# Altium schematic symbol library jlcpcb_2025_04_resistors_extended_2512.schlib: 2667 symbols (part 6 of 14) (continued)
## CR2512J330RE04Z
designator R?  Resistance: 330Ω  (hidden comment: *)
Resistor, 330Ω, ±5%, 1W, 200V, ±100ppm/℃, -55℃~+155℃, SMD 2512; Manufacturer: Uniroyal; Manufacturer Part Number: CR2512J330RE04Z; Supplier 1: LCSC; Supplier Part Number 1: C245723; JLCPCB Part Number: C245723; Power Rating: 1W; Category: Resistors; Package Size: 2512; JLCPCB Basic Part: Yes; Tolerance: ±5%; Voltage Rating: 200V; Temperature Coefficient: ±100ppm/℃; Temperature Rating: -55℃~+155℃; ComponentLink1Description: Datasheet; ComponentLink1URL: https://wmsc.lcsc.com/wmsc/upload/file/pdf/v2/lcsc/2304140030_Ever-Ohms-Tech-CR2512J330RE04Z_C245723.pdf; ComponentLink2Description: JLCPCB Part URL; ComponentLink2URL: https://jlcpcb.com/partdetail/C245723
pins: 1, 2
1 alternate drawing of the same symbol

## CR2512J360RE04Z
designator R?  Resistance: 360Ω  (hidden comment: *)
Resistor, 360Ω, ±5%, 1W, 200V, ±100ppm/℃, -55℃~+155℃, SMD 2512; Manufacturer: Uniroyal; Manufacturer Part Number: CR2512J360RE04Z; Supplier 1: LCSC; Supplier Part Number 1: C245724; JLCPCB Part Number: C245724; Power Rating: 1W; Category: Resistors; Package Size: 2512; JLCPCB Basic Part: Yes; Tolerance: ±5%; Voltage Rating: 200V; Temperature Coefficient: ±100ppm/℃; Temperature Rating: -55℃~+155℃; ComponentLink1Description: Datasheet; ComponentLink1URL: https://wmsc.lcsc.com/wmsc/upload/file/pdf/v2/lcsc/2304140030_Ever-Ohms-Tech-CR2512J360RE04Z_C245724.pdf; ComponentLink2Description: JLCPCB Part URL; ComponentLink2URL: https://jlcpcb.com/partdetail/C245724
pins: 1, 2
1 alternate drawing of the same symbol

## CR2512J390KE04Z
designator R?  Resistance: 390kΩ  (hidden comment: *)
Resistor, 390kΩ, ±5%, 1W, 200V, ±100ppm/℃, -55℃~+155℃, SMD 2512; Manufacturer: Uniroyal; Manufacturer Part Number: CR2512J390KE04Z; Supplier 1: LCSC; Supplier Part Number 1: C165288; JLCPCB Part Number: C165288; Power Rating: 1W; Category: Resistors; Package Size: 2512; JLCPCB Basic Part: Yes; Tolerance: ±5%; Voltage Rating: 200V; Temperature Coefficient: ±100ppm/℃; Temperature Rating: -55℃~+155℃; ComponentLink1Description: Datasheet; ComponentLink1URL: https://wmsc.lcsc.com/wmsc/upload/file/pdf/v2/lcsc/2304140030_Ever-Ohms-Tech-CR2512J390KE04Z_C165288.pdf; ComponentLink2Description: JLCPCB Part URL; ComponentLink2URL: https://jlcpcb.com/partdetail/C165288
pins: 1, 2
1 alternate drawing of the same symbol

## CR2512J390RE04Z
designator R?  Resistance: 390Ω  (hidden comment: *)
Resistor, 390Ω, ±5%, 1W, 200V, ±100ppm/℃, -55℃~+155℃, SMD 2512; Manufacturer: Uniroyal; Manufacturer Part Number: CR2512J390RE04Z; Supplier 1: LCSC; Supplier Part Number 1: C245725; JLCPCB Part Number: C245725; Power Rating: 1W; Category: Resistors; Package Size: 2512; JLCPCB Basic Part: Yes; Tolerance: ±5%; Voltage Rating: 200V; Temperature Coefficient: ±100ppm/℃; Temperature Rating: -55℃~+155℃; ComponentLink1Description: Datasheet; ComponentLink1URL: https://wmsc.lcsc.com/wmsc/upload/file/pdf/v2/lcsc/2304140030_Ever-Ohms-Tech-CR2512J390RE04Z_C245725.pdf; ComponentLink2Description: JLCPCB Part URL; ComponentLink2URL: https://jlcpcb.com/partdetail/C245725
pins: 1, 2
1 alternate drawing of the same symbol

## CR2512J430KE04Z
designator R?  Resistance: 430kΩ  (hidden comment: *)
Resistor, 430kΩ, ±5%, 1W, 200V, ±100ppm/℃, -55℃~+155℃, SMD 2512; Manufacturer: Uniroyal; Manufacturer Part Number: CR2512J430KE04Z; Supplier 1: LCSC; Supplier Part Number 1: C175489; JLCPCB Part Number: C175489; Power Rating: 1W; Category: Resistors; Package Size: 2512; JLCPCB Basic Part: Yes; Tolerance: ±5%; Voltage Rating: 200V; Temperature Coefficient: ±100ppm/℃; Temperature Rating: -55℃~+155℃; ComponentLink1Description: Datasheet; ComponentLink1URL: https://wmsc.lcsc.com/wmsc/upload/file/pdf/v2/lcsc/2304140030_Ever-Ohms-Tech-CR2512J430KE04Z_C175489.pdf; ComponentLink2Description: JLCPCB Part URL; ComponentLink2URL: https://jlcpcb.com/partdetail/C175489
pins: 1, 2
1 alternate drawing of the same symbol

## CR2512J430RE04Z
designator R?  Resistance: 430Ω  (hidden comment: *)
Resistor, 430Ω, ±5%, 1W, 200V, ±100ppm/℃, -55℃~+155℃, SMD 2512; Manufacturer: Uniroyal; Manufacturer Part Number: CR2512J430RE04Z; Supplier 1: LCSC; Supplier Part Number 1: C332249; JLCPCB Part Number: C332249; Power Rating: 1W; Category: Resistors; Package Size: 2512; JLCPCB Basic Part: Yes; Tolerance: ±5%; Voltage Rating: 200V; Temperature Coefficient: ±100ppm/℃; Temperature Rating: -55℃~+155℃; ComponentLink1Description: Datasheet; ComponentLink1URL: https://wmsc.lcsc.com/wmsc/upload/file/pdf/v2/lcsc/2304140030_Ever-Ohms-Tech-CR2512J430RE04Z_C332249.pdf; ComponentLink2Description: JLCPCB Part URL; ComponentLink2URL: https://jlcpcb.com/partdetail/C332249
pins: 1, 2
1 alternate drawing of the same symbol

## CR2512J470KE04Z
designator R?  Resistance: 470kΩ  (hidden comment: *)
Resistor, 470kΩ, ±5%, 1W, 200V, ±100ppm/℃, -55℃~+155℃, SMD 2512; Manufacturer: Uniroyal; Manufacturer Part Number: CR2512J470KE04Z; Supplier 1: LCSC; Supplier Part Number 1: C147268; JLCPCB Part Number: C147268; Power Rating: 1W; Category: Resistors; Package Size: 2512; JLCPCB Basic Part: Yes; Tolerance: ±5%; Voltage Rating: 200V; Temperature Coefficient: ±100ppm/℃; Temperature Rating: -55℃~+155℃; ComponentLink1Description: Datasheet; ComponentLink1URL: https://wmsc.lcsc.com/wmsc/upload/file/pdf/v2/lcsc/2304140030_Ever-Ohms-Tech-CR2512J470KE04Z_C147268.pdf; ComponentLink2Description: JLCPCB Part URL; ComponentLink2URL: https://jlcpcb.com/partdetail/C147268
pins: 1, 2
1 alternate drawing of the same symbol

## CR2512J470RE04Z
designator R?  Resistance: 470Ω  (hidden comment: *)
Resistor, 470Ω, ±5%, 1W, 200V, ±100ppm/℃, -55℃~+155℃, SMD 2512; Manufacturer: Uniroyal; Manufacturer Part Number: CR2512J470RE04Z; Supplier 1: LCSC; Supplier Part Number 1: C175453; JLCPCB Part Number: C175453; Power Rating: 1W; Category: Resistors; Package Size: 2512; JLCPCB Basic Part: Yes; Tolerance: ±5%; Voltage Rating: 200V; Temperature Coefficient: ±100ppm/℃; Temperature Rating: -55℃~+155℃; ComponentLink1Description: Datasheet; ComponentLink1URL: https://wmsc.lcsc.com/wmsc/upload/file/pdf/v2/lcsc/2304140030_Ever-Ohms-Tech-CR2512J470RE04Z_C175453.pdf; ComponentLink2Description: JLCPCB Part URL; ComponentLink2URL: https://jlcpcb.com/partdetail/C175453
pins: 1, 2
1 alternate drawing of the same symbol

## CR2512J510RE04Z
designator R?  Resistance: 510Ω  (hidden comment: *)
Resistor, 510Ω, ±5%, 1W, 200V, ±100ppm/℃, -55℃~+155℃, SMD 2512; Manufacturer: Uniroyal; Manufacturer Part Number: CR2512J510RE04Z; Supplier 1: LCSC; Supplier Part Number 1: C146896; JLCPCB Part Number: C146896; Power Rating: 1W; Category: Resistors; Package Size: 2512; JLCPCB Basic Part: Yes; Tolerance: ±5%; Voltage Rating: 200V; Temperature Coefficient: ±100ppm/℃; Temperature Rating: -55℃~+155℃; ComponentLink1Description: Datasheet; ComponentLink1URL: https://wmsc.lcsc.com/wmsc/upload/file/pdf/v2/lcsc/2304140030_Ever-Ohms-Tech-CR2512J510RE04Z_C146896.pdf; ComponentLink2Description: JLCPCB Part URL; ComponentLink2URL: https://jlcpcb.com/partdetail/C146896
pins: 1, 2
1 alternate drawing of the same symbol

## CR2512J560RE04Z
designator R?  Resistance: 560Ω  (hidden comment: *)
Resistor, 560Ω, ±5%, 1W, 200V, ±100ppm/℃, -55℃~+155℃, SMD 2512; Manufacturer: Uniroyal; Manufacturer Part Number: CR2512J560RE04Z; Supplier 1: LCSC; Supplier Part Number 1: C146986; JLCPCB Part Number: C146986; Power Rating: 1W; Category: Resistors; Package Size: 2512; JLCPCB Basic Part: Yes; Tolerance: ±5%; Voltage Rating: 200V; Temperature Coefficient: ±100ppm/℃; Temperature Rating: -55℃~+155℃; ComponentLink1Description: Datasheet; ComponentLink1URL: https://wmsc.lcsc.com/wmsc/upload/file/pdf/v2/lcsc/2304140030_Ever-Ohms-Tech-CR2512J560RE04Z_C146986.pdf; ComponentLink2Description: JLCPCB Part URL; ComponentLink2URL: https://jlcpcb.com/partdetail/C146986
pins: 1, 2
1 alternate drawing of the same symbol

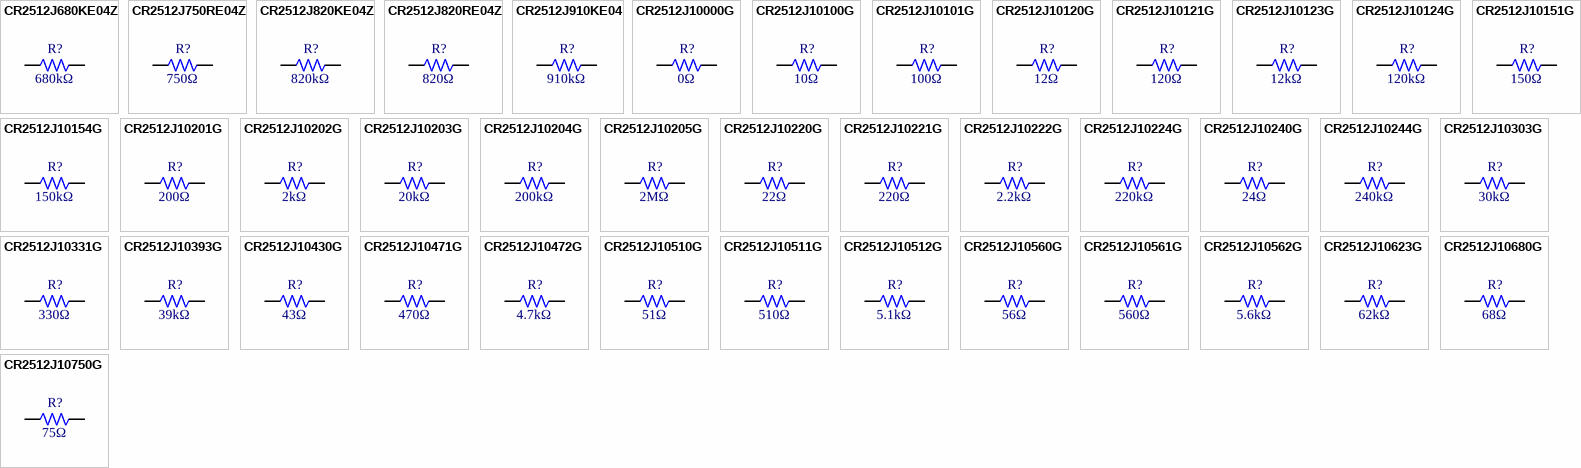
[diagram p26: symbols CR2512J680KE04Z to CR2512J10750G]

## CR2512J680KE04Z
designator R?  Resistance: 680kΩ  (hidden comment: *)
Resistor, 680kΩ, ±5%, 1W, 200V, ±100ppm/℃, -55℃~+155℃, SMD 2512; Manufacturer: Uniroyal; Manufacturer Part Number: CR2512J680KE04Z; Supplier 1: LCSC; Supplier Part Number 1: C165282; JLCPCB Part Number: C165282; Power Rating: 1W; Category: Resistors; Package Size: 2512; JLCPCB Basic Part: Yes; Tolerance: ±5%; Voltage Rating: 200V; Temperature Coefficient: ±100ppm/℃; Temperature Rating: -55℃~+155℃; ComponentLink1Description: Datasheet; ComponentLink1URL: https://wmsc.lcsc.com/wmsc/upload/file/pdf/v2/lcsc/2304140030_Ever-Ohms-Tech-CR2512J680KE04Z_C165282.pdf; ComponentLink2Description: JLCPCB Part URL; ComponentLink2URL: https://jlcpcb.com/partdetail/C165282
pins: 1, 2
1 alternate drawing of the same symbol

## CR2512J750RE04Z
designator R?  Resistance: 750Ω  (hidden comment: *)
Resistor, 750Ω, ±5%, 1W, 200V, ±100ppm/℃, -55℃~+155℃, SMD 2512; Manufacturer: Uniroyal; Manufacturer Part Number: CR2512J750RE04Z; Supplier 1: LCSC; Supplier Part Number 1: C332251; JLCPCB Part Number: C332251; Power Rating: 1W; Category: Resistors; Package Size: 2512; JLCPCB Basic Part: Yes; Tolerance: ±5%; Voltage Rating: 200V; Temperature Coefficient: ±100ppm/℃; Temperature Rating: -55℃~+155℃; ComponentLink1Description: Datasheet; ComponentLink1URL: https://wmsc.lcsc.com/wmsc/upload/file/pdf/v2/lcsc/2304140030_Ever-Ohms-Tech-CR2512J750RE04Z_C332251.pdf; ComponentLink2Description: JLCPCB Part URL; ComponentLink2URL: https://jlcpcb.com/partdetail/C332251
pins: 1, 2
1 alternate drawing of the same symbol

## CR2512J820KE04Z
designator R?  Resistance: 820kΩ  (hidden comment: *)
Resistor, 820kΩ, ±5%, 1W, 200V, ±100ppm/℃, -55℃~+155℃, SMD 2512; Manufacturer: Uniroyal; Manufacturer Part Number: CR2512J820KE04Z; Supplier 1: LCSC; Supplier Part Number 1: C149861; JLCPCB Part Number: C149861; Power Rating: 1W; Category: Resistors; Package Size: 2512; JLCPCB Basic Part: Yes; Tolerance: ±5%; Voltage Rating: 200V; Temperature Coefficient: ±100ppm/℃; Temperature Rating: -55℃~+155℃; ComponentLink1Description: Datasheet; ComponentLink1URL: https://wmsc.lcsc.com/wmsc/upload/file/pdf/v2/lcsc/2304140030_Ever-Ohms-Tech-CR2512J820KE04Z_C149861.pdf; ComponentLink2Description: JLCPCB Part URL; ComponentLink2URL: https://jlcpcb.com/partdetail/C149861
pins: 1, 2
1 alternate drawing of the same symbol

## CR2512J820RE04Z
designator R?  Resistance: 820Ω  (hidden comment: *)
Resistor, 820Ω, ±5%, 1W, 200V, ±100ppm/℃, -55℃~+155℃, SMD 2512; Manufacturer: Uniroyal; Manufacturer Part Number: CR2512J820RE04Z; Supplier 1: LCSC; Supplier Part Number 1: C245740; JLCPCB Part Number: C245740; Power Rating: 1W; Category: Resistors; Package Size: 2512; JLCPCB Basic Part: Yes; Tolerance: ±5%; Voltage Rating: 200V; Temperature Coefficient: ±100ppm/℃; Temperature Rating: -55℃~+155℃; ComponentLink1Description: Datasheet; ComponentLink1URL: https://wmsc.lcsc.com/wmsc/upload/file/pdf/v2/lcsc/2404011707_Ever-Ohms-Tech-CR2512J820RE04Z_C245740.pdf; ComponentLink2Description: JLCPCB Part URL; ComponentLink2URL: https://jlcpcb.com/partdetail/C245740
pins: 1, 2
1 alternate drawing of the same symbol

## CR2512J910KE04
designator R?  Resistance: 910kΩ  (hidden comment: *)
Resistor, 910kΩ, ±5%, 1W, 200V, ±200ppm/℃, -55℃~+155℃, SMD 2512; Manufacturer: Uniroyal; Manufacturer Part Number: CR2512J910KE04; Supplier 1: LCSC; Supplier Part Number 1: C429560; JLCPCB Part Number: C429560; Power Rating: 1W; Category: Resistors; Package Size: 2512; JLCPCB Basic Part: Yes; Tolerance: ±5%; Voltage Rating: 200V; Temperature Coefficient: ±200ppm/℃; Temperature Rating: -55℃~+155℃; ComponentLink1Description: Datasheet; ComponentLink1URL: https://wmsc.lcsc.com/wmsc/upload/file/pdf/v2/lcsc/2304140030_Ever-Ohms-Tech-CR2512J910KE04_C429560.pdf; ComponentLink2Description: JLCPCB Part URL; ComponentLink2URL: https://jlcpcb.com/partdetail/C429560
pins: 1, 2
1 alternate drawing of the same symbol

## CR2512J10000G
designator R?  Resistance: 0Ω  (hidden comment: *)
Resistor, 0Ω, ±5%, 1W, 200V, -55℃~+125℃, SMD 2512; Manufacturer: Uniroyal; Manufacturer Part Number: CR2512J10000G; Supplier 1: LCSC; Supplier Part Number 1: C102531; JLCPCB Part Number: C102531; Power Rating: 1W; Category: Resistors; Package Size: 2512; JLCPCB Basic Part: Yes; Tolerance: ±5%; Voltage Rating: 200V; Temperature Rating: -55℃~+125℃; ComponentLink1Description: Datasheet; ComponentLink1URL: https://wmsc.lcsc.com/wmsc/upload/file/pdf/v2/lcsc/2304140030_LIZ-Elec-CR2512J10000G_C102531.pdf; ComponentLink2Description: JLCPCB Part URL; ComponentLink2URL: https://jlcpcb.com/partdetail/C102531
pins: 1, 2
1 alternate drawing of the same symbol

## CR2512J10100G
designator R?  Resistance: 10Ω  (hidden comment: *)
Resistor, 10Ω, ±5%, 1W, 200V, ±200ppm/℃, -55℃~+125℃, SMD 2512; Manufacturer: Uniroyal; Manufacturer Part Number: CR2512J10100G; Supplier 1: LCSC; Supplier Part Number 1: C102532; JLCPCB Part Number: C102532; Power Rating: 1W; Category: Resistors; Package Size: 2512; JLCPCB Basic Part: Yes; Tolerance: ±5%; Voltage Rating: 200V; Temperature Coefficient: ±200ppm/℃; Temperature Rating: -55℃~+125℃; ComponentLink1Description: Datasheet; ComponentLink1URL: https://wmsc.lcsc.com/wmsc/upload/file/pdf/v2/lcsc/2304140030_LIZ-Elec-CR2512J10100G_C102532.pdf; ComponentLink2Description: JLCPCB Part URL; ComponentLink2URL: https://jlcpcb.com/partdetail/C102532
pins: 1, 2
1 alternate drawing of the same symbol

## CR2512J10101G
designator R?  Resistance: 100Ω  (hidden comment: *)
Resistor, 100Ω, ±5%, 1W, SMD 2512; Manufacturer: Uniroyal; Manufacturer Part Number: CR2512J10101G; Supplier 1: LCSC; Supplier Part Number 1: C3037919; JLCPCB Part Number: C3037919; Power Rating: 1W; Category: Resistors; Package Size: 2512; JLCPCB Basic Part: Yes; Tolerance: ±5%; ComponentLink1Description: Datasheet; ComponentLink1URL: https://wmsc.lcsc.com/wmsc/upload/file/pdf/v2/lcsc/2206161801_LIZ-Elec-CR2512J10101G_C3037919.pdf; ComponentLink2Description: JLCPCB Part URL; ComponentLink2URL: https://jlcpcb.com/partdetail/C3037919
pins: 1, 2
1 alternate drawing of the same symbol

## CR2512J10120G
designator R?  Resistance: 12Ω  (hidden comment: *)
Resistor, 12Ω, ±5%, 1W, 200V, ±200ppm/℃, -55℃~+125℃, SMD 2512; Manufacturer: Uniroyal; Manufacturer Part Number: CR2512J10120G; Supplier 1: LCSC; Supplier Part Number 1: C102536; JLCPCB Part Number: C102536; Power Rating: 1W; Category: Resistors; Package Size: 2512; JLCPCB Basic Part: Yes; Tolerance: ±5%; Voltage Rating: 200V; Temperature Coefficient: ±200ppm/℃; Temperature Rating: -55℃~+125℃; ComponentLink1Description: Datasheet; ComponentLink1URL: https://wmsc.lcsc.com/wmsc/upload/file/pdf/v2/lcsc/2304140030_LIZ-Elec-CR2512J10120G_C102536.pdf; ComponentLink2Description: JLCPCB Part URL; ComponentLink2URL: https://jlcpcb.com/partdetail/C102536
pins: 1, 2
1 alternate drawing of the same symbol

## CR2512J10121G
designator R?  Resistance: 120Ω  (hidden comment: *)
Resistor, 120Ω, ±5%, 1W, 200V, ±200ppm/℃, -55℃~+125℃, SMD 2512; Manufacturer: Uniroyal; Manufacturer Part Number: CR2512J10121G; Supplier 1: LCSC; Supplier Part Number 1: C102537; JLCPCB Part Number: C102537; Power Rating: 1W; Category: Resistors; Package Size: 2512; JLCPCB Basic Part: Yes; Tolerance: ±5%; Voltage Rating: 200V; Temperature Coefficient: ±200ppm/℃; Temperature Rating: -55℃~+125℃; ComponentLink1Description: Datasheet; ComponentLink1URL: https://wmsc.lcsc.com/wmsc/upload/file/pdf/v2/lcsc/2304140030_LIZ-Elec-CR2512J10121G_C102537.pdf; ComponentLink2Description: JLCPCB Part URL; ComponentLink2URL: https://jlcpcb.com/partdetail/C102537
pins: 1, 2
1 alternate drawing of the same symbol

## CR2512J10123G
designator R?  Resistance: 12kΩ  (hidden comment: *)
Resistor, 12kΩ, ±5%, 1W, 200V, SMD 2512; Manufacturer: Uniroyal; Manufacturer Part Number: CR2512J10123G; Supplier 1: LCSC; Supplier Part Number 1: C3037027; JLCPCB Part Number: C3037027; Power Rating: 1W; Category: Resistors; Package Size: 2512; JLCPCB Basic Part: Yes; Tolerance: ±5%; Voltage Rating: 200V; ComponentLink1Description: Datasheet; ComponentLink1URL: https://wmsc.lcsc.com/wmsc/upload/file/pdf/v2/lcsc/2206222045_LIZ-Elec-CR2512J10123G_C3037027.pdf; ComponentLink2Description: JLCPCB Part URL; ComponentLink2URL: https://jlcpcb.com/partdetail/C3037027
pins: 1, 2
1 alternate drawing of the same symbol

## CR2512J10124G
designator R?  Resistance: 120kΩ  (hidden comment: *)
Resistor, 120kΩ, ±5%, 1W, 200V, SMD 2512; Manufacturer: Uniroyal; Manufacturer Part Number: CR2512J10124G; Supplier 1: LCSC; Supplier Part Number 1: C3037271; JLCPCB Part Number: C3037271; Power Rating: 1W; Category: Resistors; Package Size: 2512; JLCPCB Basic Part: Yes; Tolerance: ±5%; Voltage Rating: 200V; ComponentLink1Description: Datasheet; ComponentLink1URL: https://wmsc.lcsc.com/wmsc/upload/file/pdf/v2/lcsc/2206222045_LIZ-Elec-CR2512J10124G_C3037271.pdf; ComponentLink2Description: JLCPCB Part URL; ComponentLink2URL: https://jlcpcb.com/partdetail/C3037271
pins: 1, 2
1 alternate drawing of the same symbol

## CR2512J10151G
designator R?  Resistance: 150Ω  (hidden comment: *)
Resistor, 150Ω, ±5%, 1W, 200V, ±200ppm/℃, -55℃~+125℃, SMD 2512; Manufacturer: Uniroyal; Manufacturer Part Number: CR2512J10151G; Supplier 1: LCSC; Supplier Part Number 1: C102540; JLCPCB Part Number: C102540; Power Rating: 1W; Category: Resistors; Package Size: 2512; JLCPCB Basic Part: Yes; Tolerance: ±5%; Voltage Rating: 200V; Temperature Coefficient: ±200ppm/℃; Temperature Rating: -55℃~+125℃; ComponentLink1Description: Datasheet; ComponentLink1URL: https://wmsc.lcsc.com/wmsc/upload/file/pdf/v2/lcsc/2304140030_LIZ-Elec-CR2512J10151G_C102540.pdf; ComponentLink2Description: JLCPCB Part URL; ComponentLink2URL: https://jlcpcb.com/partdetail/C102540
pins: 1, 2
1 alternate drawing of the same symbol

## CR2512J10154G
designator R?  Resistance: 150kΩ  (hidden comment: *)
Resistor, 150kΩ, ±5%, 1W, 200V, ±200ppm/℃, -55℃~+125℃, SMD 2512; Manufacturer: Uniroyal; Manufacturer Part Number: CR2512J10154G; Supplier 1: LCSC; Supplier Part Number 1: C102542; JLCPCB Part Number: C102542; Power Rating: 1W; Category: Resistors; Package Size: 2512; JLCPCB Basic Part: Yes; Tolerance: ±5%; Voltage Rating: 200V; Temperature Coefficient: ±200ppm/℃; Temperature Rating: -55℃~+125℃; ComponentLink1Description: Datasheet; ComponentLink1URL: https://wmsc.lcsc.com/wmsc/upload/file/pdf/v2/lcsc/2304140030_LIZ-Elec-CR2512J10154G_C102542.pdf; ComponentLink2Description: JLCPCB Part URL; ComponentLink2URL: https://jlcpcb.com/partdetail/C102542
pins: 1, 2
1 alternate drawing of the same symbol

## CR2512J10201G
designator R?  Resistance: 200Ω  (hidden comment: *)
Resistor, 200Ω, ±5%, 1W, 200V, ±200ppm/℃, -55℃~+125℃, SMD 2512; Manufacturer: Uniroyal; Manufacturer Part Number: CR2512J10201G; Supplier 1: LCSC; Supplier Part Number 1: C102546; JLCPCB Part Number: C102546; Power Rating: 1W; Category: Resistors; Package Size: 2512; JLCPCB Basic Part: Yes; Tolerance: ±5%; Voltage Rating: 200V; Temperature Coefficient: ±200ppm/℃; Temperature Rating: -55℃~+125℃; ComponentLink1Description: Datasheet; ComponentLink1URL: https://wmsc.lcsc.com/wmsc/upload/file/pdf/v2/lcsc/2304140030_LIZ-Elec-CR2512J10201G_C102546.pdf; ComponentLink2Description: JLCPCB Part URL; ComponentLink2URL: https://jlcpcb.com/partdetail/C102546
pins: 1, 2
1 alternate drawing of the same symbol

## CR2512J10202G
designator R?  Resistance: 2kΩ  (hidden comment: *)
Resistor, 2kΩ, ±5%, 1W, SMD 2512; Manufacturer: Uniroyal; Manufacturer Part Number: CR2512J10202G; Supplier 1: LCSC; Supplier Part Number 1: C102547; JLCPCB Part Number: C102547; Power Rating: 1W; Category: Resistors; Package Size: 2512; JLCPCB Basic Part: Yes; Tolerance: ±5%; ComponentLink1Description: Datasheet; ComponentLink1URL: https://wmsc.lcsc.com/wmsc/upload/file/pdf/v2/lcsc/2304140030_LIZ-Elec-CR2512J10202G_C102547.pdf; ComponentLink2Description: JLCPCB Part URL; ComponentLink2URL: https://jlcpcb.com/partdetail/C102547
pins: 1, 2
1 alternate drawing of the same symbol

## CR2512J10203G
designator R?  Resistance: 20kΩ  (hidden comment: *)
Resistor, 20kΩ, ±5%, 1W, 200V, ±200ppm/℃, -55℃~+125℃, SMD 2512; Manufacturer: Uniroyal; Manufacturer Part Number: CR2512J10203G; Supplier 1: LCSC; Supplier Part Number 1: C102548; JLCPCB Part Number: C102548; Power Rating: 1W; Category: Resistors; Package Size: 2512; JLCPCB Basic Part: Yes; Tolerance: ±5%; Voltage Rating: 200V; Temperature Coefficient: ±200ppm/℃; Temperature Rating: -55℃~+125℃; ComponentLink1Description: Datasheet; ComponentLink1URL: https://wmsc.lcsc.com/wmsc/upload/file/pdf/v2/lcsc/2304140030_LIZ-Elec-CR2512J10203G_C102548.pdf; ComponentLink2Description: JLCPCB Part URL; ComponentLink2URL: https://jlcpcb.com/partdetail/C102548
pins: 1, 2
1 alternate drawing of the same symbol

## CR2512J10204G
designator R?  Resistance: 200kΩ  (hidden comment: *)
Resistor, 200kΩ, ±5%, 1W, 200V, SMD 2512; Manufacturer: Uniroyal; Manufacturer Part Number: CR2512J10204G; Supplier 1: LCSC; Supplier Part Number 1: C102549; JLCPCB Part Number: C102549; Power Rating: 1W; Category: Resistors; Package Size: 2512; JLCPCB Basic Part: Yes; Tolerance: ±5%; Voltage Rating: 200V; ComponentLink1Description: Datasheet; ComponentLink1URL: https://wmsc.lcsc.com/wmsc/upload/file/pdf/v2/lcsc/2304140030_LIZ-Elec-CR2512J10204G_C102549.pdf; ComponentLink2Description: JLCPCB Part URL; ComponentLink2URL: https://jlcpcb.com/partdetail/C102549
pins: 1, 2
1 alternate drawing of the same symbol

## CR2512J10205G
designator R?  Resistance: 2MΩ  (hidden comment: *)
Resistor, 2MΩ, ±5%, 1W, 200V, ±200ppm/℃, -55℃~+125℃, SMD 2512; Manufacturer: Uniroyal; Manufacturer Part Number: CR2512J10205G; Supplier 1: LCSC; Supplier Part Number 1: C102550; JLCPCB Part Number: C102550; Power Rating: 1W; Category: Resistors; Package Size: 2512; JLCPCB Basic Part: Yes; Tolerance: ±5%; Voltage Rating: 200V; Temperature Coefficient: ±200ppm/℃; Temperature Rating: -55℃~+125℃; ComponentLink1Description: Datasheet; ComponentLink1URL: https://wmsc.lcsc.com/wmsc/upload/file/pdf/v2/lcsc/2304140030_LIZ-Elec-CR2512J10205G_C102550.pdf; ComponentLink2Description: JLCPCB Part URL; ComponentLink2URL: https://jlcpcb.com/partdetail/C102550
pins: 1, 2
1 alternate drawing of the same symbol

## CR2512J10220G
designator R?  Resistance: 22Ω  (hidden comment: *)
Resistor, 22Ω, ±5%, 1W, 200V, ±200ppm/℃, -55℃~+125℃, SMD 2512; Manufacturer: Uniroyal; Manufacturer Part Number: CR2512J10220G; Supplier 1: LCSC; Supplier Part Number 1: C102551; JLCPCB Part Number: C102551; Power Rating: 1W; Category: Resistors; Package Size: 2512; JLCPCB Basic Part: Yes; Tolerance: ±5%; Voltage Rating: 200V; Temperature Coefficient: ±200ppm/℃; Temperature Rating: -55℃~+125℃; ComponentLink1Description: Datasheet; ComponentLink1URL: https://wmsc.lcsc.com/wmsc/upload/file/pdf/v2/lcsc/2304140030_LIZ-Elec-CR2512J10220G_C102551.pdf; ComponentLink2Description: JLCPCB Part URL; ComponentLink2URL: https://jlcpcb.com/partdetail/C102551
pins: 1, 2
1 alternate drawing of the same symbol

## CR2512J10221G
designator R?  Resistance: 220Ω  (hidden comment: *)
Resistor, 220Ω, ±5%, 1W, 200V, ±200ppm/℃, -55℃~+125℃, SMD 2512; Manufacturer: Uniroyal; Manufacturer Part Number: CR2512J10221G; Supplier 1: LCSC; Supplier Part Number 1: C102552; JLCPCB Part Number: C102552; Power Rating: 1W; Category: Resistors; Package Size: 2512; JLCPCB Basic Part: Yes; Tolerance: ±5%; Voltage Rating: 200V; Temperature Coefficient: ±200ppm/℃; Temperature Rating: -55℃~+125℃; ComponentLink1Description: Datasheet; ComponentLink1URL: https://wmsc.lcsc.com/wmsc/upload/file/pdf/v2/lcsc/2304140030_LIZ-Elec-CR2512J10221G_C102552.pdf; ComponentLink2Description: JLCPCB Part URL; ComponentLink2URL: https://jlcpcb.com/partdetail/C102552
pins: 1, 2
1 alternate drawing of the same symbol

## CR2512J10222G
designator R?  Resistance: 2.2kΩ  (hidden comment: *)
Resistor, 2.2kΩ, ±5%, 1W, 200V, SMD 2512; Manufacturer: Uniroyal; Manufacturer Part Number: CR2512J10222G; Supplier 1: LCSC; Supplier Part Number 1: C3037500; JLCPCB Part Number: C3037500; Power Rating: 1W; Category: Resistors; Package Size: 2512; JLCPCB Basic Part: Yes; Tolerance: ±5%; Voltage Rating: 200V; ComponentLink1Description: Datasheet; ComponentLink1URL: https://wmsc.lcsc.com/wmsc/upload/file/pdf/v2/lcsc/2206222045_LIZ-Elec-CR2512J10222G_C3037500.pdf; ComponentLink2Description: JLCPCB Part URL; ComponentLink2URL: https://jlcpcb.com/partdetail/C3037500
pins: 1, 2
1 alternate drawing of the same symbol

## CR2512J10224G
designator R?  Resistance: 220kΩ  (hidden comment: *)
Resistor, 220kΩ, ±5%, 1W, SMD 2512; Manufacturer: Uniroyal; Manufacturer Part Number: CR2512J10224G; Supplier 1: LCSC; Supplier Part Number 1: C102553; JLCPCB Part Number: C102553; Power Rating: 1W; Category: Resistors; Package Size: 2512; JLCPCB Basic Part: Yes; Tolerance: ±5%; ComponentLink1Description: Datasheet; ComponentLink1URL: https://wmsc.lcsc.com/wmsc/upload/file/pdf/v2/lcsc/2304140030_LIZ-Elec-CR2512J10224G_C102553.pdf; ComponentLink2Description: JLCPCB Part URL; ComponentLink2URL: https://jlcpcb.com/partdetail/C102553
pins: 1, 2
1 alternate drawing of the same symbol

## CR2512J10240G
designator R?  Resistance: 24Ω  (hidden comment: *)
Resistor, 24Ω, ±5%, 1W, 200V, ±200ppm/℃, -55℃~+125℃, SMD 2512; Manufacturer: Uniroyal; Manufacturer Part Number: CR2512J10240G; Supplier 1: LCSC; Supplier Part Number 1: C102554; JLCPCB Part Number: C102554; Power Rating: 1W; Category: Resistors; Package Size: 2512; JLCPCB Basic Part: Yes; Tolerance: ±5%; Voltage Rating: 200V; Temperature Coefficient: ±200ppm/℃; Temperature Rating: -55℃~+125℃; ComponentLink1Description: Datasheet; ComponentLink1URL: https://wmsc.lcsc.com/wmsc/upload/file/pdf/v2/lcsc/2304140030_LIZ-Elec-CR2512J10240G_C102554.pdf; ComponentLink2Description: JLCPCB Part URL; ComponentLink2URL: https://jlcpcb.com/partdetail/C102554
pins: 1, 2
1 alternate drawing of the same symbol

## CR2512J10244G
designator R?  Resistance: 240kΩ  (hidden comment: *)
Resistor, 240kΩ, ±5%, 1W, 200V, ±200ppm/℃, -55℃~+125℃, SMD 2512; Manufacturer: Uniroyal; Manufacturer Part Number: CR2512J10244G; Supplier 1: LCSC; Supplier Part Number 1: C102556; JLCPCB Part Number: C102556; Power Rating: 1W; Category: Resistors; Package Size: 2512; JLCPCB Basic Part: Yes; Tolerance: ±5%; Voltage Rating: 200V; Temperature Coefficient: ±200ppm/℃; Temperature Rating: -55℃~+125℃; ComponentLink1Description: Datasheet; ComponentLink1URL: https://wmsc.lcsc.com/wmsc/upload/file/pdf/v2/lcsc/2304140030_LIZ-Elec-CR2512J10244G_C102556.pdf; ComponentLink2Description: JLCPCB Part URL; ComponentLink2URL: https://jlcpcb.com/partdetail/C102556
pins: 1, 2
1 alternate drawing of the same symbol

## CR2512J10303G
designator R?  Resistance: 30kΩ  (hidden comment: *)
Resistor, 30kΩ, ±5%, 1W, 200V, ±200ppm/℃, -55℃~+125℃, SMD 2512; Manufacturer: Uniroyal; Manufacturer Part Number: CR2512J10303G; Supplier 1: LCSC; Supplier Part Number 1: C102566; JLCPCB Part Number: C102566; Power Rating: 1W; Category: Resistors; Package Size: 2512; JLCPCB Basic Part: Yes; Tolerance: ±5%; Voltage Rating: 200V; Temperature Coefficient: ±200ppm/℃; Temperature Rating: -55℃~+125℃; ComponentLink1Description: Datasheet; ComponentLink1URL: https://wmsc.lcsc.com/wmsc/upload/file/pdf/v2/lcsc/2304140030_LIZ-Elec-CR2512J10303G_C102566.pdf; ComponentLink2Description: JLCPCB Part URL; ComponentLink2URL: https://jlcpcb.com/partdetail/C102566
pins: 1, 2
1 alternate drawing of the same symbol

## CR2512J10331G
designator R?  Resistance: 330Ω  (hidden comment: *)
Resistor, 330Ω, ±5%, 1W, 200V, ±200ppm/℃, -55℃~+125℃, SMD 2512; Manufacturer: Uniroyal; Manufacturer Part Number: CR2512J10331G; Supplier 1: LCSC; Supplier Part Number 1: C102567; JLCPCB Part Number: C102567; Power Rating: 1W; Category: Resistors; Package Size: 2512; JLCPCB Basic Part: Yes; Tolerance: ±5%; Voltage Rating: 200V; Temperature Coefficient: ±200ppm/℃; Temperature Rating: -55℃~+125℃; ComponentLink1Description: Datasheet; ComponentLink1URL: https://wmsc.lcsc.com/wmsc/upload/file/pdf/v2/lcsc/2304140030_LIZ-Elec-CR2512J10331G_C102567.pdf; ComponentLink2Description: JLCPCB Part URL; ComponentLink2URL: https://jlcpcb.com/partdetail/C102567
pins: 1, 2
1 alternate drawing of the same symbol

## CR2512J10393G
designator R?  Resistance: 39kΩ  (hidden comment: *)
Resistor, 39kΩ, ±5%, 1W, 200V, ±200ppm/℃, -55℃~+125℃, SMD 2512; Manufacturer: Uniroyal; Manufacturer Part Number: CR2512J10393G; Supplier 1: LCSC; Supplier Part Number 1: C102573; JLCPCB Part Number: C102573; Power Rating: 1W; Category: Resistors; Package Size: 2512; JLCPCB Basic Part: Yes; Tolerance: ±5%; Voltage Rating: 200V; Temperature Coefficient: ±200ppm/℃; Temperature Rating: -55℃~+125℃; ComponentLink1Description: Datasheet; ComponentLink1URL: https://wmsc.lcsc.com/wmsc/upload/file/pdf/v2/lcsc/2304140030_LIZ-Elec-CR2512J10393G_C102573.pdf; ComponentLink2Description: JLCPCB Part URL; ComponentLink2URL: https://jlcpcb.com/partdetail/C102573
pins: 1, 2
1 alternate drawing of the same symbol

## CR2512J10430G
designator R?  Resistance: 43Ω  (hidden comment: *)
Resistor, 43Ω, ±5%, 1W, 200V, SMD 2512; Manufacturer: Uniroyal; Manufacturer Part Number: CR2512J10430G; Supplier 1: LCSC; Supplier Part Number 1: C102575; JLCPCB Part Number: C102575; Power Rating: 1W; Category: Resistors; Package Size: 2512; JLCPCB Basic Part: Yes; Tolerance: ±5%; Voltage Rating: 200V; ComponentLink1Description: Datasheet; ComponentLink1URL: https://wmsc.lcsc.com/wmsc/upload/file/pdf/v2/lcsc/2304140030_LIZ-Elec-CR2512J10430G_C102575.pdf; ComponentLink2Description: JLCPCB Part URL; ComponentLink2URL: https://jlcpcb.com/partdetail/C102575
pins: 1, 2
1 alternate drawing of the same symbol

## CR2512J10471G
designator R?  Resistance: 470Ω  (hidden comment: *)
Resistor, 470Ω, ±5%, 1W, 200V, ±200ppm/℃, -55℃~+125℃, SMD 2512; Manufacturer: Uniroyal; Manufacturer Part Number: CR2512J10471G; Supplier 1: LCSC; Supplier Part Number 1: C102577; JLCPCB Part Number: C102577; Power Rating: 1W; Category: Resistors; Package Size: 2512; JLCPCB Basic Part: Yes; Tolerance: ±5%; Voltage Rating: 200V; Temperature Coefficient: ±200ppm/℃; Temperature Rating: -55℃~+125℃; ComponentLink1Description: Datasheet; ComponentLink1URL: https://wmsc.lcsc.com/wmsc/upload/file/pdf/v2/lcsc/2304140030_LIZ-Elec-CR2512J10471G_C102577.pdf; ComponentLink2Description: JLCPCB Part URL; ComponentLink2URL: https://jlcpcb.com/partdetail/C102577
pins: 1, 2
1 alternate drawing of the same symbol

## CR2512J10472G
designator R?  Resistance: 4.7kΩ  (hidden comment: *)
Resistor, 4.7kΩ, ±5%, 1W, 200V, ±200ppm/℃, -55℃~+125℃, SMD 2512; Manufacturer: Uniroyal; Manufacturer Part Number: CR2512J10472G; Supplier 1: LCSC; Supplier Part Number 1: C102578; JLCPCB Part Number: C102578; Power Rating: 1W; Category: Resistors; Package Size: 2512; JLCPCB Basic Part: Yes; Tolerance: ±5%; Voltage Rating: 200V; Temperature Coefficient: ±200ppm/℃; Temperature Rating: -55℃~+125℃; ComponentLink1Description: Datasheet; ComponentLink1URL: https://wmsc.lcsc.com/wmsc/upload/file/pdf/v2/lcsc/2304140030_LIZ-Elec-CR2512J10472G_C102578.pdf; ComponentLink2Description: JLCPCB Part URL; ComponentLink2URL: https://jlcpcb.com/partdetail/C102578
pins: 1, 2
1 alternate drawing of the same symbol

## CR2512J10510G
designator R?  Resistance: 51Ω  (hidden comment: *)
Resistor, 51Ω, ±5%, 1W, 200V, ±200ppm/℃, -55℃~+125℃, SMD 2512; Manufacturer: Uniroyal; Manufacturer Part Number: CR2512J10510G; Supplier 1: LCSC; Supplier Part Number 1: C102582; JLCPCB Part Number: C102582; Power Rating: 1W; Category: Resistors; Package Size: 2512; JLCPCB Basic Part: Yes; Tolerance: ±5%; Voltage Rating: 200V; Temperature Coefficient: ±200ppm/℃; Temperature Rating: -55℃~+125℃; ComponentLink1Description: Datasheet; ComponentLink1URL: https://wmsc.lcsc.com/wmsc/upload/file/pdf/v2/lcsc/2304140030_LIZ-Elec-CR2512J10510G_C102582.pdf; ComponentLink2Description: JLCPCB Part URL; ComponentLink2URL: https://jlcpcb.com/partdetail/C102582
pins: 1, 2
1 alternate drawing of the same symbol

## CR2512J10511G
designator R?  Resistance: 510Ω  (hidden comment: *)
Resistor, 510Ω, ±5%, 1W, 200V, ±200ppm/℃, -55℃~+125℃, SMD 2512; Manufacturer: Uniroyal; Manufacturer Part Number: CR2512J10511G; Supplier 1: LCSC; Supplier Part Number 1: C102583; JLCPCB Part Number: C102583; Power Rating: 1W; Category: Resistors; Package Size: 2512; JLCPCB Basic Part: Yes; Tolerance: ±5%; Voltage Rating: 200V; Temperature Coefficient: ±200ppm/℃; Temperature Rating: -55℃~+125℃; ComponentLink1Description: Datasheet; ComponentLink1URL: https://wmsc.lcsc.com/wmsc/upload/file/pdf/v2/lcsc/2304140030_LIZ-Elec-CR2512J10511G_C102583.pdf; ComponentLink2Description: JLCPCB Part URL; ComponentLink2URL: https://jlcpcb.com/partdetail/C102583
pins: 1, 2
1 alternate drawing of the same symbol

## CR2512J10512G
designator R?  Resistance: 5.1kΩ  (hidden comment: *)
Resistor, 5.1kΩ, ±5%, 1W, 200V, ±200ppm/℃, -55℃~+125℃, SMD 2512; Manufacturer: Uniroyal; Manufacturer Part Number: CR2512J10512G; Supplier 1: LCSC; Supplier Part Number 1: C102584; JLCPCB Part Number: C102584; Power Rating: 1W; Category: Resistors; Package Size: 2512; JLCPCB Basic Part: Yes; Tolerance: ±5%; Voltage Rating: 200V; Temperature Coefficient: ±200ppm/℃; Temperature Rating: -55℃~+125℃; ComponentLink1Description: Datasheet; ComponentLink1URL: https://wmsc.lcsc.com/wmsc/upload/file/pdf/v2/lcsc/2304140030_LIZ-Elec-CR2512J10512G_C102584.pdf; ComponentLink2Description: JLCPCB Part URL; ComponentLink2URL: https://jlcpcb.com/partdetail/C102584
pins: 1, 2
1 alternate drawing of the same symbol

## CR2512J10560G
designator R?  Resistance: 56Ω  (hidden comment: *)
Resistor, 56Ω, ±5%, 1W, 200V, ±200ppm/℃, -55℃~+125℃, SMD 2512; Manufacturer: Uniroyal; Manufacturer Part Number: CR2512J10560G; Supplier 1: LCSC; Supplier Part Number 1: C102586; JLCPCB Part Number: C102586; Power Rating: 1W; Category: Resistors; Package Size: 2512; JLCPCB Basic Part: Yes; Tolerance: ±5%; Voltage Rating: 200V; Temperature Coefficient: ±200ppm/℃; Temperature Rating: -55℃~+125℃; ComponentLink1Description: Datasheet; ComponentLink1URL: https://wmsc.lcsc.com/wmsc/upload/file/pdf/v2/lcsc/2304140030_LIZ-Elec-CR2512J10560G_C102586.pdf; ComponentLink2Description: JLCPCB Part URL; ComponentLink2URL: https://jlcpcb.com/partdetail/C102586
pins: 1, 2
1 alternate drawing of the same symbol

## CR2512J10561G
designator R?  Resistance: 560Ω  (hidden comment: *)
Resistor, 560Ω, ±5%, 1W, 200V, ±200ppm/℃, -55℃~+125℃, SMD 2512; Manufacturer: Uniroyal; Manufacturer Part Number: CR2512J10561G; Supplier 1: LCSC; Supplier Part Number 1: C102587; JLCPCB Part Number: C102587; Power Rating: 1W; Category: Resistors; Package Size: 2512; JLCPCB Basic Part: Yes; Tolerance: ±5%; Voltage Rating: 200V; Temperature Coefficient: ±200ppm/℃; Temperature Rating: -55℃~+125℃; ComponentLink1Description: Datasheet; ComponentLink1URL: https://wmsc.lcsc.com/wmsc/upload/file/pdf/v2/lcsc/2304140030_LIZ-Elec-CR2512J10561G_C102587.pdf; ComponentLink2Description: JLCPCB Part URL; ComponentLink2URL: https://jlcpcb.com/partdetail/C102587
pins: 1, 2
1 alternate drawing of the same symbol

## CR2512J10562G
designator R?  Resistance: 5.6kΩ  (hidden comment: *)
Resistor, 5.6kΩ, ±5%, 1W, 200V, ±200ppm/℃, -55℃~+125℃, SMD 2512; Manufacturer: Uniroyal; Manufacturer Part Number: CR2512J10562G; Supplier 1: LCSC; Supplier Part Number 1: C102588; JLCPCB Part Number: C102588; Power Rating: 1W; Category: Resistors; Package Size: 2512; JLCPCB Basic Part: Yes; Tolerance: ±5%; Voltage Rating: 200V; Temperature Coefficient: ±200ppm/℃; Temperature Rating: -55℃~+125℃; ComponentLink1Description: Datasheet; ComponentLink1URL: https://wmsc.lcsc.com/wmsc/upload/file/pdf/v2/lcsc/2304140030_LIZ-Elec-CR2512J10562G_C102588.pdf; ComponentLink2Description: JLCPCB Part URL; ComponentLink2URL: https://jlcpcb.com/partdetail/C102588
pins: 1, 2
1 alternate drawing of the same symbol

## CR2512J10623G
designator R?  Resistance: 62kΩ  (hidden comment: *)
Resistor, 62kΩ, ±5%, 1W, 200V, SMD 2512; Manufacturer: Uniroyal; Manufacturer Part Number: CR2512J10623G; Supplier 1: LCSC; Supplier Part Number 1: C3037921; JLCPCB Part Number: C3037921; Power Rating: 1W; Category: Resistors; Package Size: 2512; JLCPCB Basic Part: Yes; Tolerance: ±5%; Voltage Rating: 200V; ComponentLink1Description: Datasheet; ComponentLink1URL: https://wmsc.lcsc.com/wmsc/upload/file/pdf/v2/lcsc/2206161801_LIZ-Elec-CR2512J10623G_C3037921.pdf; ComponentLink2Description: JLCPCB Part URL; ComponentLink2URL: https://jlcpcb.com/partdetail/C3037921
pins: 1, 2
1 alternate drawing of the same symbol

## CR2512J10680G
designator R?  Resistance: 68Ω  (hidden comment: *)
Resistor, 68Ω, ±5%, 1W, 200V, ±200ppm/℃, -55℃~+125℃, SMD 2512; Manufacturer: Uniroyal; Manufacturer Part Number: CR2512J10680G; Supplier 1: LCSC; Supplier Part Number 1: C102590; JLCPCB Part Number: C102590; Power Rating: 1W; Category: Resistors; Package Size: 2512; JLCPCB Basic Part: Yes; Tolerance: ±5%; Voltage Rating: 200V; Temperature Coefficient: ±200ppm/℃; Temperature Rating: -55℃~+125℃; ComponentLink1Description: Datasheet; ComponentLink1URL: https://wmsc.lcsc.com/wmsc/upload/file/pdf/v2/lcsc/2304140030_LIZ-Elec-CR2512J10680G_C102590.pdf; ComponentLink2Description: JLCPCB Part URL; ComponentLink2URL: https://jlcpcb.com/partdetail/C102590
pins: 1, 2
1 alternate drawing of the same symbol

## CR2512J10750G
designator R?  Resistance: 75Ω  (hidden comment: *)
Resistor, 75Ω, ±5%, 1W, 200V, ±200ppm/℃, -55℃~+125℃, SMD 2512; Manufacturer: Uniroyal; Manufacturer Part Number: CR2512J10750G; Supplier 1: LCSC; Supplier Part Number 1: C102592; JLCPCB Part Number: C102592; Power Rating: 1W; Category: Resistors; Package Size: 2512; JLCPCB Basic Part: Yes; Tolerance: ±5%; Voltage Rating: 200V; Temperature Coefficient: ±200ppm/℃; Temperature Rating: -55℃~+125℃; ComponentLink1Description: Datasheet; ComponentLink1URL: https://wmsc.lcsc.com/wmsc/upload/file/pdf/v2/lcsc/2304140030_LIZ-Elec-CR2512J10750G_C102592.pdf; ComponentLink2Description: JLCPCB Part URL; ComponentLink2URL: https://jlcpcb.com/partdetail/C102592
pins: 1, 2
1 alternate drawing of the same symbol
